# Altium footprint library Connector_PinHeader_1.27mm.PcbLib: 278 footprints (part 1 of 18)
Each footprint in its own frame and in the unit in brackets; x right, y up, seen from the top. Pads: shape width x height; smd on the part's side, far side on the other; paste and mask are expansions set on the pad; w line width, h text height; cw(c..) or ccw(c..) is an arc to the next point about the centre after c.
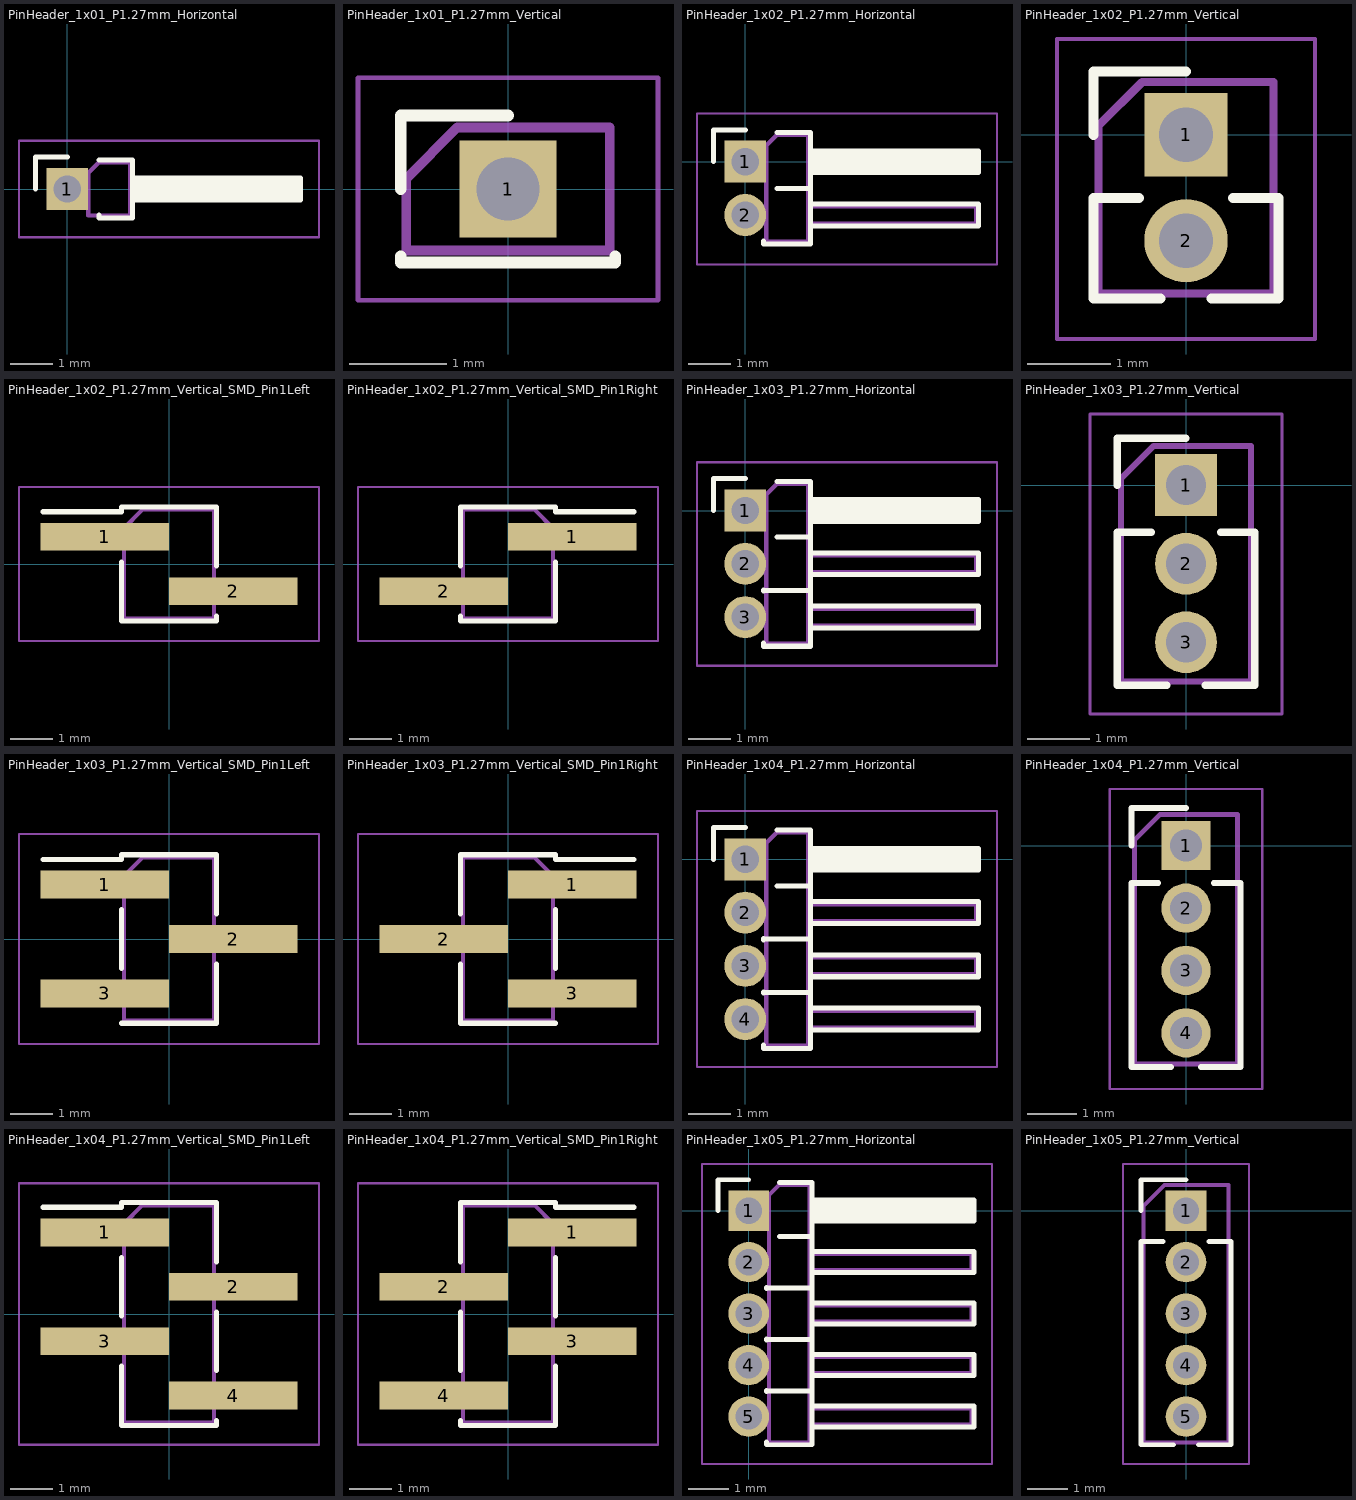
[diagram p0: the footprints below, top view; thin cyan lines are the x and y axes]

## PinHeader_1x01_P1.27mm_Horizontal [mm]
pads (1):
  rect 1x1 hole 0.65: 1(0,0)
F.SilkS:
  lines w0.12: -0.76,0 -0.76,0.76 0,0.76 ; 0.76,-0.62 0.76,-0.695 1.56,-0.695 1.56,0.695 0.76,0.695 ; 1.56,-0.26 5.56,-0.26 5.56,0.26 1.56,0.26 ; 1.56,-0.16 5.56,-0.16 ; 1.56,-0.04 5.56,-0.04 ; 1.56,0.08 5.56,0.08 ; 1.56,0.2 5.56,0.2
F.CrtYd:
  lines w0.05: -1.15,-1.15 -1.15,1.15 6,1.15 6,-1.15 -1.15,-1.15
F.Fab:
  lines w0.1: 0.5,-0.2 -0.2,-0.2 -0.2,0.2 0.5,0.2 ; 1.5,-0.2 5.5,-0.2 5.5,0.2 1.5,0.2 ; 0.5,-0.635 0.5,0.385 0.75,0.635 1.5,0.635 1.5,-0.635 0.5,-0.635
  text "'.Designator'" at 1.504,-2.428 h0.6

## PinHeader_1x01_P1.27mm_Vertical [mm]
pads (1):
  rect 1x1 hole 0.65: 1(0,0)
F.SilkS:
  lines w0.12: -1.11,-0.695 -1.11,-0.76 ; -1.11,0 -1.11,0.76 0,0.76 ; -0.563,-0.76 -1.11,-0.76 ; 0.563,-0.76 1.11,-0.76 ; 1.11,-0.695 1.11,-0.76 ; -1.11,-0.76 1.11,-0.76
F.CrtYd:
  lines w0.05: -1.55,-1.15 -1.55,1.15 1.55,1.15 1.55,-1.15 -1.55,-1.15
F.Fab:
  lines w0.1: -1.05,-0.635 1.05,-0.635 1.05,0.635 -0.525,0.635 -1.05,0.11 -1.05,-0.635
  text "'.Designator'" at 0.84,-4.047 h1

## PinHeader_1x02_P1.27mm_Horizontal [mm]
pads (2):
  rect 1x1 hole 0.65: 1(0,0)
  rrect100% 1x1 hole 0.65: 2(0,-1.27)
F.SilkS:
  lines w0.12: -0.76,0 -0.76,0.76 0,0.76 ; 0.44,-1.89 0.44,-1.965 1.56,-1.965 1.56,0.695 0.76,0.695 ; 0.76,-0.635 1.56,-0.635 ; 1.56,-1.53 5.56,-1.53 5.56,-1.01 1.56,-1.01 ; 1.56,-0.26 5.56,-0.26 5.56,0.26 1.56,0.26 ; 1.56,-0.16 5.56,-0.16 ; 1.56,-0.04 5.56,-0.04 ; 1.56,0.08 5.56,0.08 ; 1.56,0.2 5.56,0.2
F.CrtYd:
  lines w0.05: -1.15,-2.45 6,-2.45 6,1.15 -1.15,1.15 -1.15,-2.45
F.Fab:
  lines w0.1: 0.5,-1.47 -0.2,-1.47 -0.2,-1.07 0.5,-1.07 ; 0.5,-0.2 -0.2,-0.2 -0.2,0.2 0.5,0.2 ; 1.5,-1.47 5.5,-1.47 5.5,-1.07 1.5,-1.07 ; 1.5,-0.2 5.5,-0.2 5.5,0.2 1.5,0.2 ; 0.5,-1.905 1.5,-1.905 1.5,0.635 0.75,0.635 0.5,0.385 0.5,-1.905
  text "'.Designator'" at 1.504,-3.063 h0.6

## PinHeader_1x02_P1.27mm_Vertical [mm]
pads (2):
  rect 1x1 hole 0.65: 1(0,0)
  rrect100% 1x1 hole 0.65: 2(0,-1.27)
F.SilkS:
  lines w0.12: -1.11,0 -1.11,0.76 0,0.76 ; -0.563,-0.76 -1.11,-0.76 -1.11,-1.965 -0.308,-1.965 ; 0.308,-1.965 1.11,-1.965 1.11,-0.76 0.563,-0.76
F.CrtYd:
  lines w0.05: -1.55,-2.45 1.55,-2.45 1.55,1.15 -1.55,1.15 -1.55,-2.45
F.Fab:
  lines w0.1: -1.05,-1.905 1.05,-1.905 1.05,0.635 -0.525,0.635 -1.05,0.11 -1.05,-1.905
  text "'.Designator'" at 0.84,-4.682 h1

## PinHeader_1x02_P1.27mm_Vertical_SMD_Pin1Left [mm]
pads (2):
  rect 3x0.65 smd: 1(-1.5,0.635) 2(1.5,-0.635)
F.SilkS:
  lines w0.12: -2.94,1.22 -1.11,1.22 -1.11,1.33 1.11,1.33 ; -1.11,-1.33 1.11,-1.33 1.11,-1.22 ; -1.11,-1.32 -1.11,0.05 ; 1.11,-0.05 1.11,1.32
F.CrtYd:
  lines w0.05: -3.5,-1.8 3.5,-1.8 3.5,1.8 -3.5,1.8 -3.5,-1.8
F.Fab:
  lines w0.1: -1.05,0.435 -2.5,0.435 -2.5,0.835 -1.05,0.835 ; 1.05,-0.835 2.5,-0.835 2.5,-0.435 1.05,-0.435 ; -1.05,0.835 -0.615,1.27 1.05,1.27 1.05,-1.27 -1.05,-1.27 -1.05,0.835
  text "'.Designator'" at 0.84,-4.047 h1

## PinHeader_1x02_P1.27mm_Vertical_SMD_Pin1Right [mm]
pads (2):
  rect 3x0.65 smd: 1(1.5,0.635) 2(-1.5,-0.635)
F.SilkS:
  lines w0.12: -1.11,-1.22 -1.11,-1.33 1.11,-1.33 ; -1.11,-0.05 -1.11,1.32 ; -1.11,1.33 1.11,1.33 1.11,1.22 2.94,1.22 ; 1.11,-1.32 1.11,0.05
F.CrtYd:
  lines w0.05: -3.5,-1.8 3.5,-1.8 3.5,1.8 -3.5,1.8 -3.5,-1.8
F.Fab:
  lines w0.1: -1.05,-0.835 -2.5,-0.835 -2.5,-0.435 -1.05,-0.435 ; 1.05,0.435 2.5,0.435 2.5,0.835 1.05,0.835 ; 1.05,0.835 1.05,-1.27 -1.05,-1.27 -1.05,1.27 0.615,1.27 1.05,0.835
  text "'.Designator'" at 0.84,-4.047 h1

## PinHeader_1x03_P1.27mm_Horizontal [mm]
pads (3):
  rect 1x1 hole 0.65: 1(0,0)
  rrect100% 1x1 hole 0.65: 2(0,-1.27) 3(0,-2.54)
F.SilkS:
  lines w0.12: -0.76,0 -0.76,0.76 0,0.76 ; 0.44,-3.16 0.44,-3.235 1.56,-3.235 1.56,0.695 0.76,0.695 ; 0.44,-1.92 0.44,-1.89 ; 0.44,-1.905 1.56,-1.905 ; 0.76,-0.635 1.56,-0.635 ; 1.56,-2.8 5.56,-2.8 5.56,-2.28 1.56,-2.28 ; 1.56,-1.53 5.56,-1.53 5.56,-1.01 1.56,-1.01 ; 1.56,-0.26 5.56,-0.26 5.56,0.26 1.56,0.26 ; 1.56,-0.16 5.56,-0.16 ; 1.56,-0.04 5.56,-0.04 ; 1.56,0.08 5.56,0.08 ; 1.56,0.2 5.56,0.2
F.CrtYd:
  lines w0.05: -1.15,-3.7 6,-3.7 6,1.15 -1.15,1.15 -1.15,-3.7
F.Fab:
  lines w0.1: 0.5,-2.74 -0.2,-2.74 -0.2,-2.34 0.5,-2.34 ; 0.5,-1.47 -0.2,-1.47 -0.2,-1.07 0.5,-1.07 ; 0.5,-0.2 -0.2,-0.2 -0.2,0.2 0.5,0.2 ; 1.5,-2.74 5.5,-2.74 5.5,-2.34 1.5,-2.34 ; 1.5,-1.47 5.5,-1.47 5.5,-1.07 1.5,-1.07 ; 1.5,-0.2 5.5,-0.2 5.5,0.2 1.5,0.2 ; 0.5,-3.175 0.5,0.385 0.75,0.635 1.5,0.635 1.5,-3.175 0.5,-3.175
  text "'.Designator'" at 1.504,-3.698 h0.6

## PinHeader_1x03_P1.27mm_Vertical [mm]
pads (3):
  rect 1x1 hole 0.65: 1(0,0)
  rrect100% 1x1 hole 0.65: 2(0,-1.27) 3(0,-2.54)
F.SilkS:
  lines w0.12: -1.11,0 -1.11,0.76 0,0.76 ; -0.563,-0.76 -1.11,-0.76 -1.11,-3.235 -0.308,-3.235 ; 0.308,-3.235 1.11,-3.235 1.11,-0.76 0.563,-0.76
F.CrtYd:
  lines w0.05: -1.55,-3.7 -1.55,1.15 1.55,1.15 1.55,-3.7 -1.55,-3.7
F.Fab:
  lines w0.1: -1.05,-3.175 -1.05,0.11 -0.525,0.635 1.05,0.635 1.05,-3.175 -1.05,-3.175
  text "'.Designator'" at 0.84,-5.317 h1

## PinHeader_1x03_P1.27mm_Vertical_SMD_Pin1Left [mm]
pads (3):
  rect 3x0.65 smd: 1(-1.5,1.27) 2(1.5,0) 3(-1.5,-1.27)
F.SilkS:
  lines w0.12: -2.94,1.855 -1.11,1.855 -1.11,1.965 1.11,1.965 ; -1.11,-1.965 1.11,-1.965 1.11,-1.855 ; -1.11,-0.685 -1.11,0.685 ; 1.11,-1.955 1.11,-0.585 ; 1.11,0.585 1.11,1.955
F.CrtYd:
  lines w0.05: -3.5,-2.45 -3.5,2.45 3.5,2.45 3.5,-2.45 -3.5,-2.45
F.Fab:
  lines w0.1: -1.05,-1.47 -2.5,-1.47 -2.5,-1.07 -1.05,-1.07 ; -1.05,1.07 -2.5,1.07 -2.5,1.47 -1.05,1.47 ; 1.05,-0.2 2.5,-0.2 2.5,0.2 1.05,0.2 ; -1.05,1.47 -0.615,1.905 1.05,1.905 1.05,-1.905 -1.05,-1.905 -1.05,1.47
  text "'.Designator'" at 0.84,-4.047 h1

## PinHeader_1x03_P1.27mm_Vertical_SMD_Pin1Right [mm]
pads (3):
  rect 3x0.65 smd: 1(1.5,1.27) 2(-1.5,0) 3(1.5,-1.27)
F.SilkS:
  lines w0.12: -1.11,-1.955 -1.11,-0.585 ; -1.11,-1.855 -1.11,-1.965 1.11,-1.965 ; -1.11,0.585 -1.11,1.955 ; -1.11,1.965 1.11,1.965 1.11,1.855 2.94,1.855 ; 1.11,-0.685 1.11,0.685
F.CrtYd:
  lines w0.05: -3.5,-2.45 3.5,-2.45 3.5,2.45 -3.5,2.45 -3.5,-2.45
F.Fab:
  lines w0.1: -1.05,-0.2 -2.5,-0.2 -2.5,0.2 -1.05,0.2 ; 1.05,-1.47 2.5,-1.47 2.5,-1.07 1.05,-1.07 ; 1.05,1.07 2.5,1.07 2.5,1.47 1.05,1.47 ; 1.05,1.47 1.05,-1.905 -1.05,-1.905 -1.05,1.905 0.615,1.905 1.05,1.47
  text "'.Designator'" at 0.84,-4.047 h1

## PinHeader_1x04_P1.27mm_Horizontal [mm]
pads (4):
  rect 1x1 hole 0.65: 1(0,0)
  rrect100% 1x1 hole 0.65: 2(0,-1.27) 3(0,-2.54) 4(0,-3.81)
F.SilkS:
  lines w0.12: -0.76,0 -0.76,0.76 0,0.76 ; 0.44,-4.43 0.44,-4.505 1.56,-4.505 1.56,0.695 0.76,0.695 ; 0.44,-3.19 0.44,-3.16 ; 0.44,-3.175 1.56,-3.175 ; 0.44,-1.92 0.44,-1.89 ; 0.44,-1.905 1.56,-1.905 ; 0.76,-0.635 1.56,-0.635 ; 1.56,-4.07 5.56,-4.07 5.56,-3.55 1.56,-3.55 ; 1.56,-2.8 5.56,-2.8 5.56,-2.28 1.56,-2.28 ; 1.56,-1.53 5.56,-1.53 5.56,-1.01 1.56,-1.01 ; 1.56,-0.26 5.56,-0.26 5.56,0.26 1.56,0.26 ; 1.56,-0.16 5.56,-0.16 ; 1.56,-0.04 5.56,-0.04 ; 1.56,0.08 5.56,0.08 ; 1.56,0.2 5.56,0.2
F.CrtYd:
  lines w0.05: -1.15,-4.95 6,-4.95 6,1.15 -1.15,1.15 -1.15,-4.95
F.Fab:
  lines w0.1: 0.5,-4.01 -0.2,-4.01 -0.2,-3.61 0.5,-3.61 ; 0.5,-2.74 -0.2,-2.74 -0.2,-2.34 0.5,-2.34 ; 0.5,-1.47 -0.2,-1.47 -0.2,-1.07 0.5,-1.07 ; 0.5,-0.2 -0.2,-0.2 -0.2,0.2 0.5,0.2 ; 1.5,-4.01 5.5,-4.01 5.5,-3.61 1.5,-3.61 ; 1.5,-2.74 5.5,-2.74 5.5,-2.34 1.5,-2.34 ; 1.5,-1.47 5.5,-1.47 5.5,-1.07 1.5,-1.07 ; 1.5,-0.2 5.5,-0.2 5.5,0.2 1.5,0.2 ; 0.5,-4.445 1.5,-4.445 1.5,0.635 0.75,0.635 0.5,0.385 0.5,-4.445
  text "'.Designator'" at 1.504,-4.333 h0.6

## PinHeader_1x04_P1.27mm_Vertical [mm]
pads (4):
  rect 1x1 hole 0.65: 1(0,0)
  rrect100% 1x1 hole 0.65: 2(0,-1.27) 3(0,-2.54) 4(0,-3.81)
F.SilkS:
  lines w0.12: -1.11,0 -1.11,0.76 0,0.76 ; -0.563,-0.76 -1.11,-0.76 -1.11,-4.505 -0.308,-4.505 ; 0.308,-4.505 1.11,-4.505 1.11,-0.76 0.563,-0.76
F.CrtYd:
  lines w0.05: -1.55,-4.95 -1.55,1.15 1.55,1.15 1.55,-4.95 -1.55,-4.95
F.Fab:
  lines w0.1: -1.05,-4.445 1.05,-4.445 1.05,0.635 -0.525,0.635 -1.05,0.11 -1.05,-4.445
  text "'.Designator'" at 0.84,-5.952 h1

## PinHeader_1x04_P1.27mm_Vertical_SMD_Pin1Left [mm]
pads (4):
  rect 3x0.65 smd: 1(-1.5,1.905) 2(1.5,0.635) 3(-1.5,-0.635) 4(1.5,-1.905)
F.SilkS:
  lines w0.12: -2.94,2.49 -1.11,2.49 -1.11,2.6 1.11,2.6 ; -1.11,-2.6 1.11,-2.6 1.11,-2.49 ; -1.11,-2.59 -1.11,-1.22 ; -1.11,-0.05 -1.11,1.32 ; 1.11,-1.32 1.11,0.05 ; 1.11,1.22 1.11,2.59
F.CrtYd:
  lines w0.05: -3.5,-3.05 -3.5,3.05 3.5,3.05 3.5,-3.05 -3.5,-3.05
F.Fab:
  lines w0.1: -1.05,-0.835 -2.5,-0.835 -2.5,-0.435 -1.05,-0.435 ; -1.05,1.705 -2.5,1.705 -2.5,2.105 -1.05,2.105 ; 1.05,-2.105 2.5,-2.105 2.5,-1.705 1.05,-1.705 ; 1.05,0.435 2.5,0.435 2.5,0.835 1.05,0.835 ; -1.05,2.105 -0.615,2.54 1.05,2.54 1.05,-2.54 -1.05,-2.54 -1.05,2.105
  text "'.Designator'" at 0.84,-4.047 h1

## PinHeader_1x04_P1.27mm_Vertical_SMD_Pin1Right [mm]
pads (4):
  rect 3x0.65 smd: 1(1.5,1.905) 2(-1.5,0.635) 3(1.5,-0.635) 4(-1.5,-1.905)
F.SilkS:
  lines w0.12: -1.11,-2.49 -1.11,-2.6 1.11,-2.6 ; -1.11,-1.32 -1.11,0.05 ; -1.11,1.22 -1.11,2.59 ; -1.11,2.6 1.11,2.6 1.11,2.49 2.94,2.49 ; 1.11,-2.59 1.11,-1.22 ; 1.11,-0.05 1.11,1.32
F.CrtYd:
  lines w0.05: -3.5,-3.05 3.5,-3.05 3.5,3.05 -3.5,3.05 -3.5,-3.05
F.Fab:
  lines w0.1: -1.05,-2.105 -2.5,-2.105 -2.5,-1.705 -1.05,-1.705 ; -1.05,0.435 -2.5,0.435 -2.5,0.835 -1.05,0.835 ; 1.05,-0.835 2.5,-0.835 2.5,-0.435 1.05,-0.435 ; 1.05,1.705 2.5,1.705 2.5,2.105 1.05,2.105 ; 1.05,2.105 1.05,-2.54 -1.05,-2.54 -1.05,2.54 0.615,2.54 1.05,2.105
  text "'.Designator'" at 0.84,-4.047 h1

## PinHeader_1x05_P1.27mm_Horizontal [mm]
pads (5):
  rect 1x1 hole 0.65: 1(0,0)
  rrect100% 1x1 hole 0.65: 2(0,-1.27) 3(0,-2.54) 4(0,-3.81) 5(0,-5.08)
F.SilkS:
  lines w0.12: -0.76,0 -0.76,0.76 0,0.76 ; 0.44,-5.7 0.44,-5.775 1.56,-5.775 1.56,0.695 0.76,0.695 ; 0.44,-4.46 0.44,-4.43 ; 0.44,-4.445 1.56,-4.445 ; 0.44,-3.19 0.44,-3.16 ; 0.44,-3.175 1.56,-3.175 ; 0.44,-1.92 0.44,-1.89 ; 0.44,-1.905 1.56,-1.905 ; 0.76,-0.635 1.56,-0.635 ; 1.56,-5.34 5.56,-5.34 5.56,-4.82 1.56,-4.82 ; 1.56,-4.07 5.56,-4.07 5.56,-3.55 1.56,-3.55 ; 1.56,-2.8 5.56,-2.8 5.56,-2.28 1.56,-2.28 ; 1.56,-1.53 5.56,-1.53 5.56,-1.01 1.56,-1.01 ; 1.56,-0.26 5.56,-0.26 5.56,0.26 1.56,0.26 ; 1.56,-0.16 5.56,-0.16 ; 1.56,-0.04 5.56,-0.04 ; 1.56,0.08 5.56,0.08 ; 1.56,0.2 5.56,0.2
F.CrtYd:
  lines w0.05: -1.15,-6.25 6,-6.25 6,1.15 -1.15,1.15 -1.15,-6.25
F.Fab:
  lines w0.1: 0.5,-5.28 -0.2,-5.28 -0.2,-4.88 0.5,-4.88 ; 0.5,-4.01 -0.2,-4.01 -0.2,-3.61 0.5,-3.61 ; 0.5,-2.74 -0.2,-2.74 -0.2,-2.34 0.5,-2.34 ; 0.5,-1.47 -0.2,-1.47 -0.2,-1.07 0.5,-1.07 ; 0.5,-0.2 -0.2,-0.2 -0.2,0.2 0.5,0.2 ; 1.5,-5.28 5.5,-5.28 5.5,-4.88 1.5,-4.88 ; 1.5,-4.01 5.5,-4.01 5.5,-3.61 1.5,-3.61 ; 1.5,-2.74 5.5,-2.74 5.5,-2.34 1.5,-2.34 ; 1.5,-1.47 5.5,-1.47 5.5,-1.07 1.5,-1.07 ; 1.5,-0.2 5.5,-0.2 5.5,0.2 1.5,0.2 ; 0.5,-5.715 1.5,-5.715 1.5,0.635 0.75,0.635 0.5,0.385 0.5,-5.715
  text "'.Designator'" at 1.504,-4.968 h0.6

## PinHeader_1x05_P1.27mm_Vertical [mm]
pads (5):
  rect 1x1 hole 0.65: 1(0,0)
  rrect100% 1x1 hole 0.65: 2(0,-1.27) 3(0,-2.54) 4(0,-3.81) 5(0,-5.08)
F.SilkS:
  lines w0.12: -1.11,0 -1.11,0.76 0,0.76 ; -0.563,-0.76 -1.11,-0.76 -1.11,-5.775 -0.308,-5.775 ; 0.308,-5.775 1.11,-5.775 1.11,-0.76 0.563,-0.76
F.CrtYd:
  lines w0.05: -1.55,-6.25 1.55,-6.25 1.55,1.15 -1.55,1.15 -1.55,-6.25
F.Fab:
  lines w0.1: -1.05,-5.715 1.05,-5.715 1.05,0.635 -0.525,0.635 -1.05,0.11 -1.05,-5.715
  text "'.Designator'" at 0.84,-6.587 h1